# Altium footprint library ACTION_插件.PcbLib: 118 footprints (part 3 of 8)
Each footprint in its own frame and in the unit in brackets; x right, y up, seen from the top. Pads: shape width x height; smd on the part's side, far side on the other; paste and mask are expansions set on the pad; w line width, h text height; cw(c..) or ccw(c..) is an arc to the next point about the centre after c.
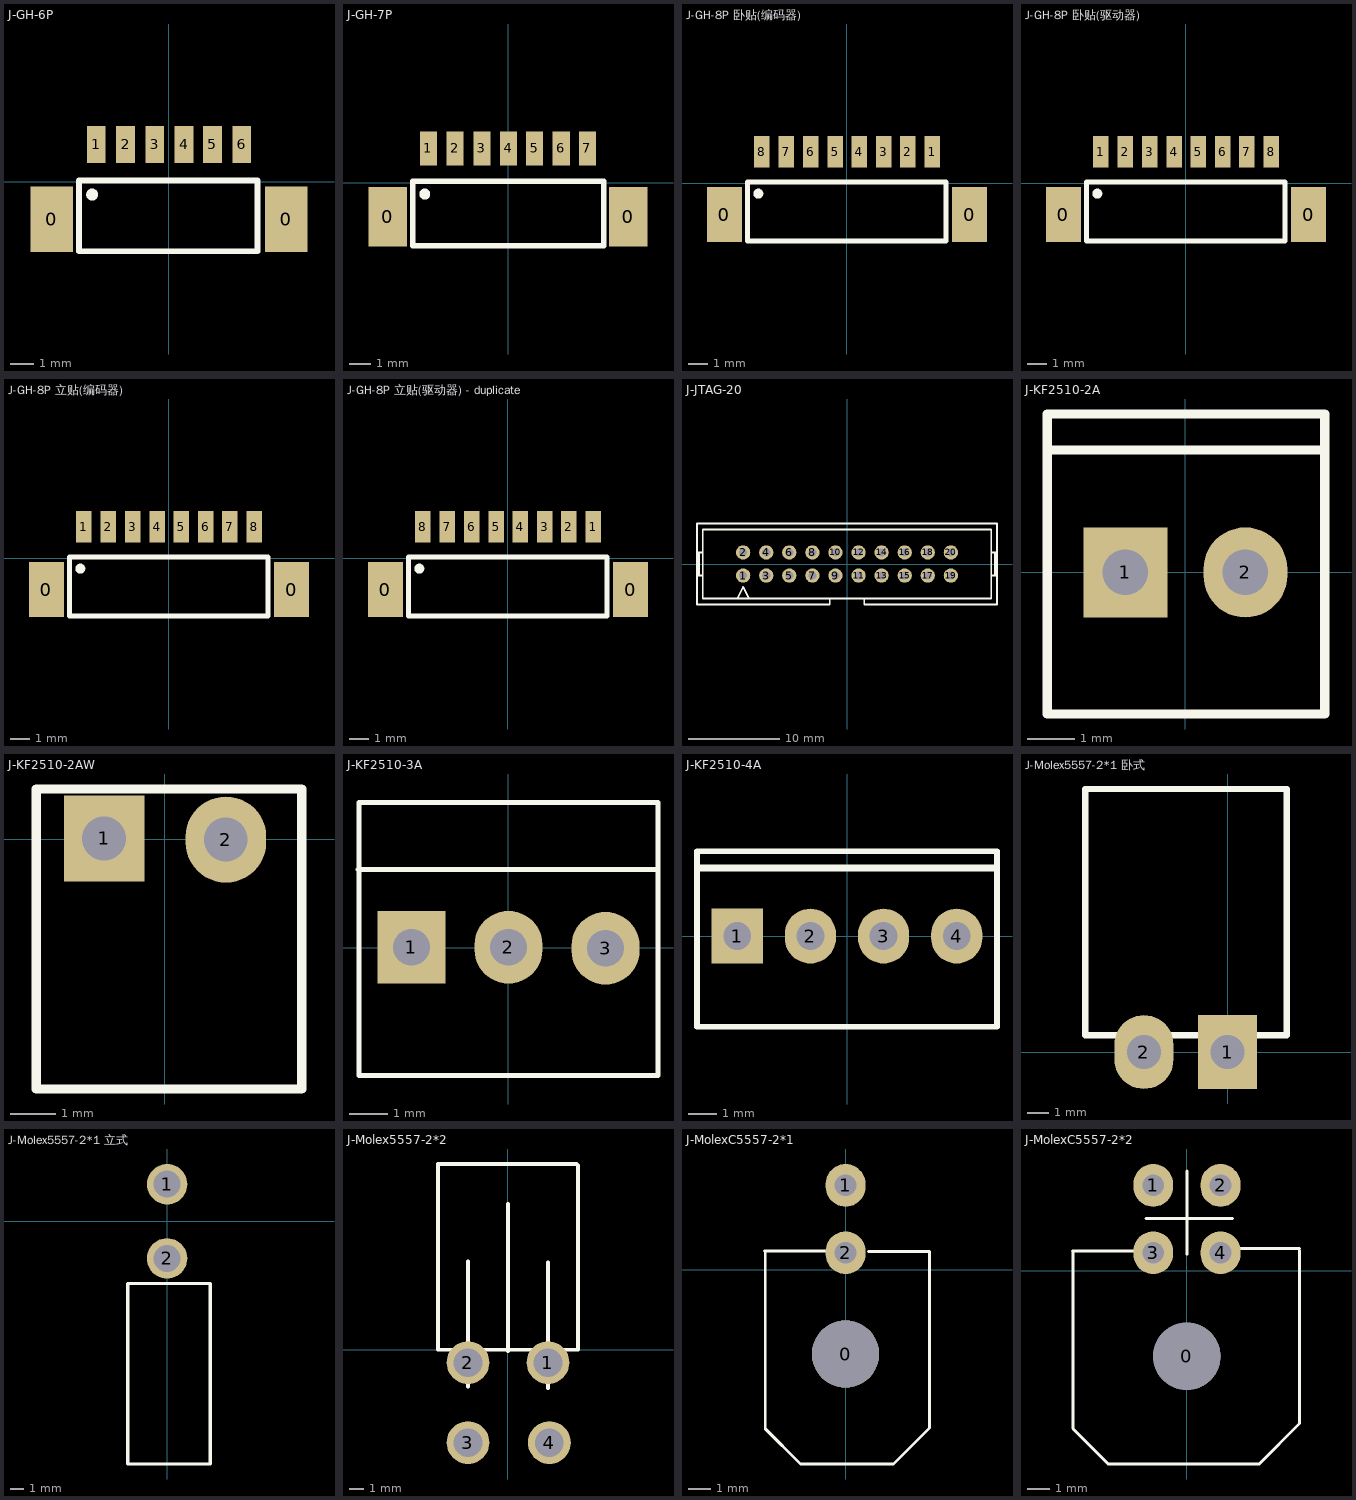
[diagram p2: the footprints below, top view; thin cyan lines are the x and y axes]

## J-GH-6P [mm]
pads (8):
  rect 1.8x2.8 smd: 0(-5.006,-1.601) 0(5.006,-1.599)
  rect 0.8x1.6 smd: 1(-3.108,1.601) 2(-1.858,1.601) 3(-0.608,1.601) 4(0.642,1.601) 5(1.856,1.601) 6(3.106,1.601)
Top Overlay:
  circle w0.254: c-3.283,-0.538 r0.127
  lines w0.254: -3.842,-2.958 3.778,-2.958 3.778,0.065 -3.842,0.065 -3.842,-2.958
3D body "SM06B-GHS-TB.stp": height 4.45, standoff 0.15, extent -5.289,-2.996 5.461,1.854

## J-GH-7P [mm]
pads (9):
  rect 1.8x2.8 smd: 0(-5.619,-1.601) 0(5.619,-1.599)
  rect 0.8x1.6 smd: 1(-3.721,1.601) 2(-2.471,1.601) 3(-1.221,1.601) 4(0.029,1.601) 5(1.243,1.601) 6(2.493,1.601) 7(3.72,1.601)
Top Overlay:
  circle w0.254: c-3.896,-0.538 r0.127
  lines w0.254: -4.455,-2.958 4.486,-2.958 4.486,0.065 -4.455,0.065 -4.455,-2.958
3D body "SM07B-GHS-TB.stp": height 4.45, standoff 0.15, extent -6.025,-3.041 5.975,1.809

## J-GH-8P 卧贴(编码器) [mm]
pads (10):
  rect 1.8x2.8 smd: 0(-6.244,-1.601) 0(6.245,-1.601)
  rect 0.8x1.6 smd: 1(4.344,1.601) 2(3.094,1.601) 3(1.868,1.601) 4(0.618,1.601) 5(-0.596,1.601) 6(-1.846,1.601) 7(-3.096,1.601) 8(-4.346,1.601)
Top Overlay:
  circle w0.254: c-4.521,-0.538 r0.127
  lines w0.254: -5.08,-2.958 -5.08,0.065 5.055,0.065 5.055,-2.958 -5.08,-2.958
3D body "SM08B-GHS-TB.stp": height 4.45, standoff 0.15, extent -6.65,-2.996 6.6,1.854

## J-GH-8P 卧贴(驱动器) [mm]
pads (10):
  rect 1.8x2.8 smd: 0(-6.244,-1.601) 0(6.245,-1.601)
  rect 0.8x1.6 smd: 1(-4.346,1.601) 2(-3.096,1.601) 3(-1.846,1.601) 4(-0.596,1.601) 5(0.618,1.601) 6(1.868,1.601) 7(3.094,1.601) 8(4.344,1.601)
Top Overlay:
  circle w0.254: c-4.521,-0.538 r0.127
  lines w0.254: -5.08,-2.958 -5.08,0.065 5.055,0.065 5.055,-2.958 -5.08,-2.958
3D body "SM08B-GHS-TB.stp": height 4.45, standoff 0.15, extent -6.65,-2.996 6.6,1.854

## J-GH-8P 立贴(编码器) [mm]
pads (10):
  rect 1.8x2.8 smd: 0(-6.244,-1.601) 0(6.245,-1.601)
  rect 0.8x1.6 smd: 1(-4.346,1.601) 2(-3.096,1.601) 3(-1.846,1.601) 4(-0.596,1.601) 5(0.618,1.601) 6(1.868,1.601) 7(3.094,1.601) 8(4.344,1.601)
Top Overlay:
  circle w0.254: c-4.521,-0.538 r0.127
  lines w0.254: -5.08,-2.958 -5.08,0.065 5.055,0.065 5.055,-2.958 -5.08,-2.958
3D body "SM08B-GHS-TB.stp": height 4.45, standoff 0.15, extent -6.65,-2.996 6.6,1.854

## J-GH-8P 立贴(驱动器) - duplicate [mm]
pads (10):
  rect 1.8x2.8 smd: 0(-6.244,-1.601) 0(6.245,-1.601)
  rect 0.8x1.6 smd: 1(4.344,1.601) 2(3.094,1.601) 3(1.868,1.601) 4(0.618,1.601) 5(-0.596,1.601) 6(-1.846,1.601) 7(-3.096,1.601) 8(-4.346,1.601)
Top Overlay:
  circle w0.254: c-4.521,-0.538 r0.127
  lines w0.254: -5.08,-2.958 5.055,-2.958 5.055,0.065 -5.08,0.065 -5.08,-2.958
3D body "SM08B-GHS-TB.stp": height 4.45, standoff 0.15, extent -6.65,-2.996 6.6,1.854

## J-JTAG-20 [mil]
pads (20):
  round 62 hole 35: 1(-450,-50) 2(-450,50) 3(-350,-50) 4(-350,50) 5(-250,-50) 6(-250,50) 7(-150,-50) 8(-150,50) 9(-50,-50) 10(-50,50) 11(50,-50) 12(50,50) 13(150,-50) 14(150,50) 15(250,-50) 16(250,50) 17(350,-50) 18(350,50) 19(450,-50) 20(450,50)
Top Overlay:
  lines w8: -650,-50 -625,-50 ; -650,50 -625,50 ; -641.67,-50 -641.67,50 ; -475,-150 -450,-100 -425,-150 ; -339.57,-175 -75,-175 -75,-150 ; -325,-175 -650,-175 -650,175 650,175 650,-175 325,-175 75,-175 75,-150 ; 625,-50 650,-50 ; 625,50 650,50 ; 641.67,-50 641.67,50 ; -75,-150 75,-150 ; -75,-150 -625,-150 -625,150 625,150 625,-150 75,-150
3D body "BH-20.STEP": height 348.1, standoff -129.92, extent -636,-179 665.57,183.2

## J-KF2510-2A [mil]
pads (2):
  rect 70x75.06 hole 38: 1(-50,0)
  oval 70x75.06 hole 38: 2(50,0)
Top Overlay:
  lines w7.87: -115,102 116,102 ; -115,-118 -115,132 116,132 116,-118 -115,-118
3D body "KF2510 2PIN直针.STEP": height 420.74, standoff -139.1, extent -99,-121 101,129

## J-KF2510-2AW [mil]
pads (2):
  rect 70x75.06 hole 38: 1(-53,0.5)
  oval 70x75.06 hole 38: 2(53,-0.5)
Top Overlay:
  lines w7.87: -112,-217.5 119,-217.5 119,43.5 -112,43.5 -112,-217.5
3D body "KF2510 2PIN.stp": height 229.17, standoff -93.66, extent -99.99,-517.87 100.01,14.41

## J-KF2510-3A [mil]
pads (3):
  rect 70x75 hole 38: 1(-100,0.5)
  oval 70x75 hole 38: 2(0,0.5) 3(100,-0.5)
Top Overlay:
  lines w5: -155,80.5 153,80.5 ; -154,-131.5 -154,149.5 154,149.5 154,-131.5 -154,-131.5
3D body "KF2512 3PIN直针.STEP": height 420.74, standoff -139.1, extent -151,-124.5 149,125.5

## J-KF2510-4A [mil]
pads (4):
  rect 70x75 hole 38: 1(-150,0)
  oval 70x75 hole 38: 2(-50,0) 3(50,0) 4(150,0)
Top Overlay:
  lines w7.87: -205,-124 -205,116 205,116 205,-124 -205,-124
  lines w10: -199,93 204,93
3D body "KF2510 4PIN直针.STEP": height 477.5, standoff -122.5, extent -201,-118 199,112

## J-Molex5557-2*1 卧式 [mm]
pads (2):
  rect 2.8x3.5 hole 1.6: 1(0,0)
  oval 2.8x3.5 hole 1.6: 2(-3.96,0)
Top Overlay:
  lines w0.3: -6.731,0.8 2.794,0.8 2.794,12.446 -6.731,12.446 -6.731,0.8
3D body: height 5.5, standoff 0, extent -6.731,-0.537 2.794,12.446

## J-Molex5557-2*1 立式 [mm]
pads (2):
  round 3 hole 2: 1(0.005,2.75) 2(-0.005,-2.75)
Top Overlay:
  lines w0.254: -2.921,-17.998 3.2,-17.998 3.2,-4.612 -2.921,-4.612 -2.921,-17.998
3D body "4.2mm连接件.STEP": height 10.93, standoff -4.64, extent -2.616,-17.873 2.884,3.467

## J-Molex5557-2*2 [mm]
pads (4):
  round 3 hole 2: 1(2.8,-0.9) 2(-2.8,-0.9) 3(-2.8,-6.5) 4(2.9,-6.5)
Top Overlay:
  lines w0.254: -2.8,-2.6 -2.8,6.201 ; 0,-0.1 0,10.2 ; 2.8,-2.7 2.8,6.101 ; -4.9,0 -4.9,13 4.7,13 4.8,13 4.9,12.9 4.9,0 -4.9,0

## J-MolexС5557-2*1 [mil]
pads (3):
  round 118.11 hole 118.11: 0(0,-148)
  oval 70x75.06 hole 38: 1(0,148) 2(0,29.89)
Top Overlay:
  lines w5: -142,33 -24,33 ; -141,30 -141,-279 -79,-341 ; -78,-341 -79,-341 ; 40,32 147,32 147,-278 84,-341 -79,-341

## J-MolexС5557-2*2 [mm]
pads (5):
  round 3 hole 3: 0(0,-3.81)
  oval 1.778x1.906 hole 0.965: 1(-1.5,3.81) 2(1.5,3.81) 3(-1.5,0.81) 4(1.5,0.81)
Top Overlay:
  lines w0.127: -5.107,0.889 -2.11,0.889 ; -5.081,0.813 -5.081,-7.036 -3.507,-8.611 ; -3.481,-8.611 -3.507,-8.611 ; -1.83,2.337 2.031,2.337 ; -0.001,0.737 -0.001,4.445 ; 1.929,0.991 5.028,0.991 ; 5.028,0.914 5.028,-6.807 3.224,-8.611 -3.507,-8.611
3D body "User Library-molex43045-0400.STEP": height 8.83, standoff -3.12, extent -5.1,-8.049 5.05,4.191